# Altium footprint library 3.22-杂项.PcbLib: 199 footprints (part 11 of 15)
Each footprint in its own frame and in the unit in brackets; x right, y up, seen from the top. Pads: shape width x height; smd on the part's side, far side on the other; paste and mask are expansions set on the pad; w line width, h text height; cw(c..) or ccw(c..) is an arc to the next point about the centre after c.
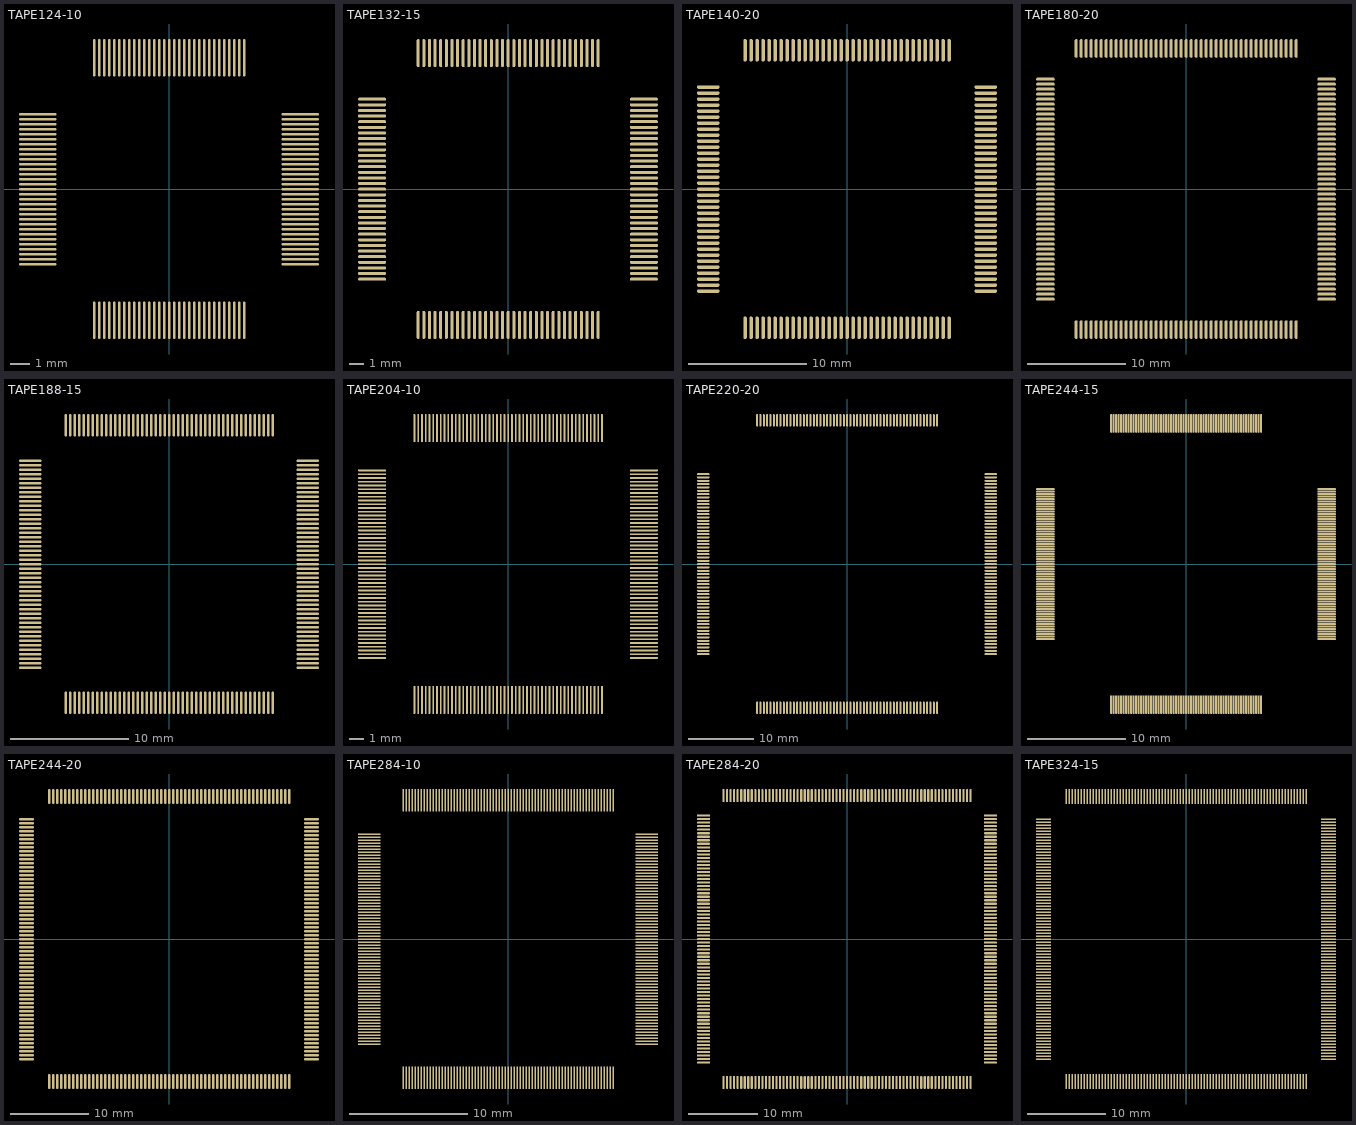
[diagram p10: the footprints below, top view; thin cyan lines are the x and y axes]

## TAPE124-10 [mil]
pads (124):
  oval 75x5 smd: 1(-262.5,149.5) 2(-262.5,139.5) 3(-262.5,129.5) 4(-262.5,119.5) 5(-262.5,109.5) 6(-262.5,99.5) 7(-262.5,89.5) 8(-262.5,79.5) 9(-262.5,69.5) 10(-262.5,59.5) 11(-262.5,49.5) 12(-262.5,39.5) 13(-262.5,29.5) 14(-262.5,19.5) 15(-262.5,9.5) 16(-262.5,-0.5) 17(-262.5,-10.5) 18(-262.5,-20.5) 19(-262.5,-30.5) 20(-262.5,-40.5) 21(-262.5,-50.5) 22(-262.5,-60.5) 23(-262.5,-70.5) 24(-262.5,-80.5) 25(-262.5,-90.5) 26(-262.5,-100.5) 27(-262.5,-110.5) 28(-262.5,-120.5) 29(-262.5,-130.5) 30(-262.5,-140.5) 31(-262.5,-150.5) 63(262.5,-150.5) 64(262.5,-140.5) 65(262.5,-130.5) 66(262.5,-120.5) 67(262.5,-110.5) 68(262.5,-100.5) 69(262.5,-90.5) 70(262.5,-80.5) 71(262.5,-70.5) 72(262.5,-60.5) 73(262.5,-50.5) 74(262.5,-40.5) 75(262.5,-30.5) 76(262.5,-20.5) 77(262.5,-10.5) 78(262.5,-0.5) 79(262.5,9.5) 80(262.5,19.5) 81(262.5,29.5) 82(262.5,39.5) 83(262.5,49.5) 84(262.5,59.5) 85(262.5,69.5) 86(262.5,79.5) 87(262.5,89.5) 88(262.5,99.5) 89(262.5,109.5) 90(262.5,119.5) 91(262.5,129.5) 92(262.5,139.5) 93(262.5,149.5)
  oval 5x75 smd: 32(-149.5,-262.5) 33(-139.5,-262.5) 34(-129.5,-262.5) 35(-119.5,-262.5) 36(-109.5,-262.5) 37(-99.5,-262.5) 38(-89.5,-262.5) 39(-79.5,-262.5) 40(-69.5,-262.5) 41(-59.5,-262.5) 42(-49.5,-262.5) 43(-39.5,-262.5) 44(-29.5,-262.5) 45(-19.5,-262.5) 46(-9.5,-262.5) 47(0.5,-262.5) 48(10.5,-262.5) 49(20.5,-262.5) 50(30.5,-262.5) 51(40.5,-262.5) 52(50.5,-262.5) 53(60.5,-262.5) 54(70.5,-262.5) 55(80.5,-262.5) 56(90.5,-262.5) 57(100.5,-262.5) 58(110.5,-262.5) 59(120.5,-262.5) 60(130.5,-262.5) 61(140.5,-262.5) 62(150.5,-262.5) 94(150.5,262.5) 95(140.5,262.5) 96(130.5,262.5) 97(120.5,262.5) 98(110.5,262.5) 99(100.5,262.5) 100(90.5,262.5) 101(80.5,262.5) 102(70.5,262.5) 103(60.5,262.5) 104(50.5,262.5) 105(40.5,262.5) 106(30.5,262.5) 107(20.5,262.5) 108(10.5,262.5) 109(0.5,262.5) 110(-9.5,262.5) 111(-19.5,262.5) 112(-29.5,262.5) 113(-39.5,262.5) 114(-49.5,262.5) 115(-59.5,262.5) 116(-69.5,262.5) 117(-79.5,262.5) 118(-89.5,262.5) 119(-99.5,262.5) 120(-109.5,262.5) 121(-119.5,262.5) 122(-129.5,262.5) 123(-139.5,262.5) 124(-149.5,262.5)

## TAPE132-15 [mil]
pads (132):
  oval 75x8 smd: 1(-362.5,239.5) 2(-362.5,224.5) 3(-362.5,209.5) 4(-362.5,194.5) 5(-362.5,179.5) 6(-362.5,164.5) 7(-362.5,149.5) 8(-362.5,134.5) 9(-362.5,119.5) 10(-362.5,104.5) 11(-362.5,89.5) 12(-362.5,74.5) 13(-362.5,59.5) 14(-362.5,44.5) 15(-362.5,29.5) 16(-362.5,14.5) 17(-362.5,-0.5) 18(-362.5,-15.5) 19(-362.5,-30.5) 20(-362.5,-45.5) 21(-362.5,-60.5) 22(-362.5,-75.5) 23(-362.5,-90.5) 24(-362.5,-105.5) 25(-362.5,-120.5) 26(-362.5,-135.5) 27(-362.5,-150.5) 28(-362.5,-165.5) 29(-362.5,-180.5) 30(-362.5,-195.5) 31(-362.5,-210.5) 32(-362.5,-225.5) 33(-362.5,-240.5) 67(362.5,-240.5) 68(362.5,-225.5) 69(362.5,-210.5) 70(362.5,-195.5) 71(362.5,-180.5) 72(362.5,-165.5) 73(362.5,-150.5) 74(362.5,-135.5) 75(362.5,-120.5) 76(362.5,-105.5) 77(362.5,-90.5) 78(362.5,-75.5) 79(362.5,-60.5) 80(362.5,-45.5) 81(362.5,-30.5) 82(362.5,-15.5) 83(362.5,-0.5) 84(362.5,14.5) 85(362.5,29.5) 86(362.5,44.5) 87(362.5,59.5) 88(362.5,74.5) 89(362.5,89.5) 90(362.5,104.5) 91(362.5,119.5) 92(362.5,134.5) 93(362.5,149.5) 94(362.5,164.5) 95(362.5,179.5) 96(362.5,194.5) 97(362.5,209.5) 98(362.5,224.5) 99(362.5,239.5)
  oval 8x75 smd: 34(-239.5,-362.5) 35(-224.5,-362.5) 36(-209.5,-362.5) 37(-194.5,-362.5) 38(-179.5,-362.5) 39(-164.5,-362.5) 40(-149.5,-362.5) 41(-134.5,-362.5) 42(-119.5,-362.5) 43(-104.5,-362.5) 44(-89.5,-362.5) 45(-74.5,-362.5) 46(-59.5,-362.5) 47(-44.5,-362.5) 48(-29.5,-362.5) 49(-14.5,-362.5) 50(0.5,-362.5) 51(15.5,-362.5) 52(30.5,-362.5) 53(45.5,-362.5) 54(60.5,-362.5) 55(75.5,-362.5) 56(90.5,-362.5) 57(105.5,-362.5) 58(120.5,-362.5) 59(135.5,-362.5) 60(150.5,-362.5) 61(165.5,-362.5) 62(180.5,-362.5) 63(195.5,-362.5) 64(210.5,-362.5) 65(225.5,-362.5) 66(240.5,-362.5) 100(240.5,362.5) 101(225.5,362.5) 102(210.5,362.5) 103(195.5,362.5) 104(180.5,362.5) 105(165.5,362.5) 106(150.5,362.5) 107(135.5,362.5) 108(120.5,362.5) 109(105.5,362.5) 110(90.5,362.5) 111(75.5,362.5) 112(60.5,362.5) 113(45.5,362.5) 114(30.5,362.5) 115(15.5,362.5) 116(0.5,362.5) 117(-14.5,362.5) 118(-29.5,362.5) 119(-44.5,362.5) 120(-59.5,362.5) 121(-74.5,362.5) 122(-89.5,362.5) 123(-104.5,362.5) 124(-119.5,362.5) 125(-134.5,362.5) 126(-149.5,362.5) 127(-164.5,362.5) 128(-179.5,362.5) 129(-194.5,362.5) 130(-209.5,362.5) 131(-224.5,362.5) 132(-239.5,362.5)

## TAPE140-20 [mil]
pads (140):
  oval 75x12 smd: 1(-462.5,339.5) 2(-462.5,319.5) 3(-462.5,299.5) 4(-462.5,279.5) 5(-462.5,259.5) 6(-462.5,239.5) 7(-462.5,219.5) 8(-462.5,199.5) 9(-462.5,179.5) 10(-462.5,159.5) 11(-462.5,139.5) 12(-462.5,119.5) 13(-462.5,99.5) 14(-462.5,79.5) 15(-462.5,59.5) 16(-462.5,39.5) 17(-462.5,19.5) 18(-462.5,-0.5) 19(-462.5,-20.5) 20(-462.5,-40.5) 21(-462.5,-60.5) 22(-462.5,-80.5) 23(-462.5,-100.5) 24(-462.5,-120.5) 25(-462.5,-140.5) 26(-462.5,-160.5) 27(-462.5,-180.5) 28(-462.5,-200.5) 29(-462.5,-220.5) 30(-462.5,-240.5) 31(-462.5,-260.5) 32(-462.5,-280.5) 33(-462.5,-300.5) 34(-462.5,-320.5) 35(-462.5,-340.5) 71(462.5,-340.5) 72(462.5,-320.5) 73(462.5,-300.5) 74(462.5,-280.5) 75(462.5,-260.5) 76(462.5,-240.5) 77(462.5,-220.5) 78(462.5,-200.5) 79(462.5,-180.5) 80(462.5,-160.5) 81(462.5,-140.5) 82(462.5,-120.5) 83(462.5,-100.5) 84(462.5,-80.5) 85(462.5,-60.5) 86(462.5,-40.5) 87(462.5,-20.5) 88(462.5,-0.5) 89(462.5,19.5) 90(462.5,39.5) 91(462.5,59.5) 92(462.5,79.5) 93(462.5,99.5) 94(462.5,119.5) 95(462.5,139.5) 96(462.5,159.5) 97(462.5,179.5) 98(462.5,199.5) 99(462.5,219.5) 100(462.5,239.5) 101(462.5,259.5) 102(462.5,279.5) 103(462.5,299.5) 104(462.5,319.5) 105(462.5,339.5)
  oval 12x75 smd: 36(-339.5,-462.5) 37(-319.5,-462.5) 38(-299.5,-462.5) 39(-279.5,-462.5) 40(-259.5,-462.5) 41(-239.5,-462.5) 42(-219.5,-462.5) 43(-199.5,-462.5) 44(-179.5,-462.5) 45(-159.5,-462.5) 46(-139.5,-462.5) 47(-119.5,-462.5) 48(-99.5,-462.5) 49(-79.5,-462.5) 50(-59.5,-462.5) 51(-39.5,-462.5) 52(-19.5,-462.5) 53(0.5,-462.5) 54(20.5,-462.5) 55(40.5,-462.5) 56(60.5,-462.5) 57(80.5,-462.5) 58(100.5,-462.5) 59(120.5,-462.5) 60(140.5,-462.5) 61(160.5,-462.5) 62(180.5,-462.5) 63(200.5,-462.5) 64(220.5,-462.5) 65(240.5,-462.5) 66(260.5,-462.5) 67(280.5,-462.5) 68(300.5,-462.5) 69(320.5,-462.5) 70(340.5,-462.5) 106(340.5,462.5) 107(320.5,462.5) 108(300.5,462.5) 109(280.5,462.5) 110(260.5,462.5) 111(240.5,462.5) 112(220.5,462.5) 113(200.5,462.5) 114(180.5,462.5) 115(160.5,462.5) 116(140.5,462.5) 117(120.5,462.5) 118(100.5,462.5) 119(80.5,462.5) 120(60.5,462.5) 121(40.5,462.5) 122(20.5,462.5) 123(0.5,462.5) 124(-19.5,462.5) 125(-39.5,462.5) 126(-59.5,462.5) 127(-79.5,462.5) 128(-99.5,462.5) 129(-119.5,462.5) 130(-139.5,462.5) 131(-159.5,462.5) 132(-179.5,462.5) 133(-199.5,462.5) 134(-219.5,462.5) 135(-239.5,462.5) 136(-259.5,462.5) 137(-279.5,462.5) 138(-299.5,462.5) 139(-319.5,462.5) 140(-339.5,462.5)

## TAPE180-20 [mil]
pads (180):
  oval 75x12 smd: 1(-562.5,439.5) 2(-562.5,419.5) 3(-562.5,399.5) 4(-562.5,379.5) 5(-562.5,359.5) 6(-562.5,339.5) 7(-562.5,319.5) 8(-562.5,299.5) 9(-562.5,279.5) 10(-562.5,259.5) 11(-562.5,239.5) 12(-562.5,219.5) 13(-562.5,199.5) 14(-562.5,179.5) 15(-562.5,159.5) 16(-562.5,139.5) 17(-562.5,119.5) 18(-562.5,99.5) 19(-562.5,79.5) 20(-562.5,59.5) 21(-562.5,39.5) 22(-562.5,19.5) 23(-562.5,-0.5) 24(-562.5,-20.5) 25(-562.5,-40.5) 26(-562.5,-60.5) 27(-562.5,-80.5) 28(-562.5,-100.5) 29(-562.5,-120.5) 30(-562.5,-140.5) 31(-562.5,-160.5) 32(-562.5,-180.5) 33(-562.5,-200.5) 34(-562.5,-220.5) 35(-562.5,-240.5) 36(-562.5,-260.5) 37(-562.5,-280.5) 38(-562.5,-300.5) 39(-562.5,-320.5) 40(-562.5,-340.5) 41(-562.5,-360.5) 42(-562.5,-380.5) 43(-562.5,-400.5) 44(-562.5,-420.5) 45(-562.5,-440.5) 91(562.5,-440.5) 92(562.5,-420.5) 93(562.5,-400.5) 94(562.5,-380.5) 95(562.5,-360.5) 96(562.5,-340.5) 97(562.5,-320.5) 98(562.5,-300.5) 99(562.5,-280.5) 100(562.5,-260.5) 101(562.5,-240.5) 102(562.5,-220.5) 103(562.5,-200.5) 104(562.5,-180.5) 105(562.5,-160.5) 106(562.5,-140.5) 107(562.5,-120.5) 108(562.5,-100.5) 109(562.5,-80.5) 110(562.5,-60.5) 111(562.5,-40.5) 112(562.5,-20.5) 113(562.5,-0.5) 114(562.5,19.5) 115(562.5,39.5) 116(562.5,59.5) 117(562.5,79.5) 118(562.5,99.5) 119(562.5,119.5) 120(562.5,139.5) 121(562.5,159.5) 122(562.5,179.5) 123(562.5,199.5) 124(562.5,219.5) 125(562.5,239.5) 126(562.5,259.5) 127(562.5,279.5) 128(562.5,299.5) 129(562.5,319.5) 130(562.5,339.5) 131(562.5,359.5) 132(562.5,379.5) 133(562.5,399.5) 134(562.5,419.5) 135(562.5,439.5)
  oval 12x75 smd: 46(-439.5,-562.5) 47(-419.5,-562.5) 48(-399.5,-562.5) 49(-379.5,-562.5) 50(-359.5,-562.5) 51(-339.5,-562.5) 52(-319.5,-562.5) 53(-299.5,-562.5) 54(-279.5,-562.5) 55(-259.5,-562.5) 56(-239.5,-562.5) 57(-219.5,-562.5) 58(-199.5,-562.5) 59(-179.5,-562.5) 60(-159.5,-562.5) 61(-139.5,-562.5) 62(-119.5,-562.5) 63(-99.5,-562.5) 64(-79.5,-562.5) 65(-59.5,-562.5) 66(-39.5,-562.5) 67(-19.5,-562.5) 68(0.5,-562.5) 69(20.5,-562.5) 70(40.5,-562.5) 71(60.5,-562.5) 72(80.5,-562.5) 73(100.5,-562.5) 74(120.5,-562.5) 75(140.5,-562.5) 76(160.5,-562.5) 77(180.5,-562.5) 78(200.5,-562.5) 79(220.5,-562.5) 80(240.5,-562.5) 81(260.5,-562.5) 82(280.5,-562.5) 83(300.5,-562.5) 84(320.5,-562.5) 85(340.5,-562.5) 86(360.5,-562.5) 87(380.5,-562.5) 88(400.5,-562.5) 89(420.5,-562.5) 90(440.5,-562.5) 136(440.5,562.5) 137(420.5,562.5) 138(400.5,562.5) 139(380.5,562.5) 140(360.5,562.5) 141(340.5,562.5) 142(320.5,562.5) 143(300.5,562.5) 144(280.5,562.5) 145(260.5,562.5) 146(240.5,562.5) 147(220.5,562.5) 148(200.5,562.5) 149(180.5,562.5) 150(160.5,562.5) 151(140.5,562.5) 152(120.5,562.5) 153(100.5,562.5) 154(80.5,562.5) 155(60.5,562.5) 156(40.5,562.5) 157(20.5,562.5) 158(0.5,562.5) 159(-19.5,562.5) 160(-39.5,562.5) 161(-59.5,562.5) 162(-79.5,562.5) 163(-99.5,562.5) 164(-119.5,562.5) 165(-139.5,562.5) 166(-159.5,562.5) 167(-179.5,562.5) 168(-199.5,562.5) 169(-219.5,562.5) 170(-239.5,562.5) 171(-259.5,562.5) 172(-279.5,562.5) 173(-299.5,562.5) 174(-319.5,562.5) 175(-339.5,562.5) 176(-359.5,562.5) 177(-379.5,562.5) 178(-399.5,562.5) 179(-419.5,562.5) 180(-439.5,562.5)

## TAPE188-15 [mil]
pads (188):
  oval 75x8 smd: 1(-462.5,344.5) 2(-462.5,329.5) 3(-462.5,314.5) 4(-462.5,299.5) 5(-462.5,284.5) 6(-462.5,269.5) 7(-462.5,254.5) 8(-462.5,239.5) 9(-462.5,224.5) 10(-462.5,209.5) 11(-462.5,194.5) 12(-462.5,179.5) 13(-462.5,164.5) 14(-462.5,149.5) 15(-462.5,134.5) 16(-462.5,119.5) 17(-462.5,104.5) 18(-462.5,89.5) 19(-462.5,74.5) 20(-462.5,59.5) 21(-462.5,44.5) 22(-462.5,29.5) 23(-462.5,14.5) 24(-462.5,-0.5) 25(-462.5,-15.5) 26(-462.5,-30.5) 27(-462.5,-45.5) 28(-462.5,-60.5) 29(-462.5,-75.5) 30(-462.5,-90.5) 31(-462.5,-105.5) 32(-462.5,-120.5) 33(-462.5,-135.5) 34(-462.5,-150.5) 35(-462.5,-165.5) 36(-462.5,-180.5) 37(-462.5,-195.5) 38(-462.5,-210.5) 39(-462.5,-225.5) 40(-462.5,-240.5) 41(-462.5,-255.5) 42(-462.5,-270.5) 43(-462.5,-285.5) 44(-462.5,-300.5) 45(-462.5,-315.5) 46(-462.5,-330.5) 47(-462.5,-345.5) 95(462.5,-345.5) 96(462.5,-330.5) 97(462.5,-315.5) 98(462.5,-300.5) 99(462.5,-285.5) 100(462.5,-270.5) 101(462.5,-255.5) 102(462.5,-240.5) 103(462.5,-225.5) 104(462.5,-210.5) 105(462.5,-195.5) 106(462.5,-180.5) 107(462.5,-165.5) 108(462.5,-150.5) 109(462.5,-135.5) 110(462.5,-120.5) 111(462.5,-105.5) 112(462.5,-90.5) 113(462.5,-75.5) 114(462.5,-60.5) 115(462.5,-45.5) 116(462.5,-30.5) 117(462.5,-15.5) 118(462.5,-0.5) 119(462.5,14.5) 120(462.5,29.5) 121(462.5,44.5) 122(462.5,59.5) 123(462.5,74.5) 124(462.5,89.5) 125(462.5,104.5) 126(462.5,119.5) 127(462.5,134.5) 128(462.5,149.5) 129(462.5,164.5) 130(462.5,179.5) 131(462.5,194.5) 132(462.5,209.5) 133(462.5,224.5) 134(462.5,239.5) 135(462.5,254.5) 136(462.5,269.5) 137(462.5,284.5) 138(462.5,299.5) 139(462.5,314.5) 140(462.5,329.5) 141(462.5,344.5)
  oval 8x75 smd: 48(-344.5,-462.5) 49(-329.5,-462.5) 50(-314.5,-462.5) 51(-299.5,-462.5) 52(-284.5,-462.5) 53(-269.5,-462.5) 54(-254.5,-462.5) 55(-239.5,-462.5) 56(-224.5,-462.5) 57(-209.5,-462.5) 58(-194.5,-462.5) 59(-179.5,-462.5) 60(-164.5,-462.5) 61(-149.5,-462.5) 62(-134.5,-462.5) 63(-119.5,-462.5) 64(-104.5,-462.5) 65(-89.5,-462.5) 66(-74.5,-462.5) 67(-59.5,-462.5) 68(-44.5,-462.5) 69(-29.5,-462.5) 70(-14.5,-462.5) 71(0.5,-462.5) 72(15.5,-462.5) 73(30.5,-462.5) 74(45.5,-462.5) 75(60.5,-462.5) 76(75.5,-462.5) 77(90.5,-462.5) 78(105.5,-462.5) 79(120.5,-462.5) 80(135.5,-462.5) 81(150.5,-462.5) 82(165.5,-462.5) 83(180.5,-462.5) 84(195.5,-462.5) 85(210.5,-462.5) 86(225.5,-462.5) 87(240.5,-462.5) 88(255.5,-462.5) 89(270.5,-462.5) 90(285.5,-462.5) 91(300.5,-462.5) 92(315.5,-462.5) 93(330.5,-462.5) 94(345.5,-462.5) 142(345.5,462.5) 143(330.5,462.5) 144(315.5,462.5) 145(300.5,462.5) 146(285.5,462.5) 147(270.5,462.5) 148(255.5,462.5) 149(240.5,462.5) 150(225.5,462.5) 151(210.5,462.5) 152(195.5,462.5) 153(180.5,462.5) 154(165.5,462.5) 155(150.5,462.5) 156(135.5,462.5) 157(120.5,462.5) 158(105.5,462.5) 159(90.5,462.5) 160(75.5,462.5) 161(60.5,462.5) 162(45.5,462.5) 163(30.5,462.5) 164(15.5,462.5) 165(0.5,462.5) 166(-14.5,462.5) 167(-29.5,462.5) 168(-44.5,462.5) 169(-59.5,462.5) 170(-74.5,462.5) 171(-89.5,462.5) 172(-104.5,462.5) 173(-119.5,462.5) 174(-134.5,462.5) 175(-149.5,462.5) 176(-164.5,462.5) 177(-179.5,462.5) 178(-194.5,462.5) 179(-209.5,462.5) 180(-224.5,462.5) 181(-239.5,462.5) 182(-254.5,462.5) 183(-269.5,462.5) 184(-284.5,462.5) 185(-299.5,462.5) 186(-314.5,462.5) 187(-329.5,462.5) 188(-344.5,462.5)

## TAPE204-10 [mil]
pads (204):
  oval 75x5 smd: 1(-362.5,249.5) 2(-362.5,239.5) 3(-362.5,229.5) 4(-362.5,219.5) 5(-362.5,209.5) 6(-362.5,199.5) 7(-362.5,189.5) 8(-362.5,179.5) 9(-362.5,169.5) 10(-362.5,159.5) 11(-362.5,149.5) 12(-362.5,139.5) 13(-362.5,129.5) 14(-362.5,119.5) 15(-362.5,109.5) 16(-362.5,99.5) 17(-362.5,89.5) 18(-362.5,79.5) 19(-362.5,69.5) 20(-362.5,59.5) 21(-362.5,49.5) 22(-362.5,39.5) 23(-362.5,29.5) 24(-362.5,19.5) 25(-362.5,9.5) 26(-362.5,-0.5) 27(-362.5,-10.5) 28(-362.5,-20.5) 29(-362.5,-30.5) 30(-362.5,-40.5) 31(-362.5,-50.5) 32(-362.5,-60.5) 33(-362.5,-70.5) 34(-362.5,-80.5) 35(-362.5,-90.5) 36(-362.5,-100.5) 37(-362.5,-110.5) 38(-362.5,-120.5) 39(-362.5,-130.5) 40(-362.5,-140.5) 41(-362.5,-150.5) 42(-362.5,-160.5) 43(-362.5,-170.5) 44(-362.5,-180.5) 45(-362.5,-190.5) 46(-362.5,-200.5) 47(-362.5,-210.5) 48(-362.5,-220.5) 49(-362.5,-230.5) 50(-362.5,-240.5) 51(-362.5,-250.5) 103(362.5,-250.5) 104(362.5,-240.5) 105(362.5,-230.5) 106(362.5,-220.5) 107(362.5,-210.5) 108(362.5,-200.5) 109(362.5,-190.5) 110(362.5,-180.5) 111(362.5,-170.5) 112(362.5,-160.5) 113(362.5,-150.5) 114(362.5,-140.5) 115(362.5,-130.5) 116(362.5,-120.5) 117(362.5,-110.5) 118(362.5,-100.5) 119(362.5,-90.5) 120(362.5,-80.5) 121(362.5,-70.5) 122(362.5,-60.5) 123(362.5,-50.5) 124(362.5,-40.5) 125(362.5,-30.5) 126(362.5,-20.5) 127(362.5,-10.5) 128(362.5,-0.5) 129(362.5,9.5) 130(362.5,19.5) 131(362.5,29.5) 132(362.5,39.5) 133(362.5,49.5) 134(362.5,59.5) 135(362.5,69.5) 136(362.5,79.5) 137(362.5,89.5) 138(362.5,99.5) 139(362.5,109.5) 140(362.5,119.5) 141(362.5,129.5) 142(362.5,139.5) 143(362.5,149.5) 144(362.5,159.5) 145(362.5,169.5) 146(362.5,179.5) 147(362.5,189.5) 148(362.5,199.5) 149(362.5,209.5) 150(362.5,219.5) 151(362.5,229.5) 152(362.5,239.5) 153(362.5,249.5)
  oval 5x75 smd: 52(-249.5,-362.5) 53(-239.5,-362.5) 54(-229.5,-362.5) 55(-219.5,-362.5) 56(-209.5,-362.5) 57(-199.5,-362.5) 58(-189.5,-362.5) 59(-179.5,-362.5) 60(-169.5,-362.5) 61(-159.5,-362.5) 62(-149.5,-362.5) 63(-139.5,-362.5) 64(-129.5,-362.5) 65(-119.5,-362.5) 66(-109.5,-362.5) 67(-99.5,-362.5) 68(-89.5,-362.5) 69(-79.5,-362.5) 70(-69.5,-362.5) 71(-59.5,-362.5) 72(-49.5,-362.5) 73(-39.5,-362.5) 74(-29.5,-362.5) 75(-19.5,-362.5) 76(-9.5,-362.5) 77(0.5,-362.5) 78(10.5,-362.5) 79(20.5,-362.5) 80(30.5,-362.5) 81(40.5,-362.5) 82(50.5,-362.5) 83(60.5,-362.5) 84(70.5,-362.5) 85(80.5,-362.5) 86(90.5,-362.5) 87(100.5,-362.5) 88(110.5,-362.5) 89(120.5,-362.5) 90(130.5,-362.5) 91(140.5,-362.5) 92(150.5,-362.5) 93(160.5,-362.5) 94(170.5,-362.5) 95(180.5,-362.5) 96(190.5,-362.5) 97(200.5,-362.5) 98(210.5,-362.5) 99(220.5,-362.5) 100(230.5,-362.5) 101(240.5,-362.5) 102(250.5,-362.5) 154(250.5,362.5) 155(240.5,362.5) 156(230.5,362.5) 157(220.5,362.5) 158(210.5,362.5) 159(200.5,362.5) 160(190.5,362.5) 161(180.5,362.5) 162(170.5,362.5) 163(160.5,362.5) 164(150.5,362.5) 165(140.5,362.5) 166(130.5,362.5) 167(120.5,362.5) 168(110.5,362.5) 169(100.5,362.5) 170(90.5,362.5) 171(80.5,362.5) 172(70.5,362.5) 173(60.5,362.5) 174(50.5,362.5) 175(40.5,362.5) 176(30.5,362.5) 177(20.5,362.5) 178(10.5,362.5) 179(0.5,362.5) 180(-9.5,362.5) 181(-19.5,362.5) 182(-29.5,362.5) 183(-39.5,362.5) 184(-49.5,362.5) 185(-59.5,362.5) 186(-69.5,362.5) 187(-79.5,362.5) 188(-89.5,362.5) 189(-99.5,362.5) 190(-109.5,362.5) 191(-119.5,362.5) 192(-129.5,362.5) 193(-139.5,362.5) 194(-149.5,362.5) 195(-159.5,362.5) 196(-169.5,362.5) 197(-179.5,362.5) 198(-189.5,362.5) 199(-199.5,362.5) 200(-209.5,362.5) 201(-219.5,362.5) 202(-229.5,362.5) 203(-239.5,362.5) 204(-249.5,362.5)

## TAPE220-20 [mil]
pads (220):
  oval 75x12 smd: 1(-862.5,539.5) 2(-862.5,519.5) 3(-862.5,499.5) 4(-862.5,479.5) 5(-862.5,459.5) 6(-862.5,439.5) 7(-862.5,419.5) 8(-862.5,399.5) 9(-862.5,379.5) 10(-862.5,359.5) 11(-862.5,339.5) 12(-862.5,319.5) 13(-862.5,299.5) 14(-862.5,279.5) 15(-862.5,259.5) 16(-862.5,239.5) 17(-862.5,219.5) 18(-862.5,199.5) 19(-862.5,179.5) 20(-862.5,159.5) 21(-862.5,139.5) 22(-862.5,119.5) 23(-862.5,99.5) 24(-862.5,79.5) 25(-862.5,59.5) 26(-862.5,39.5) 27(-862.5,19.5) 28(-862.5,-0.5) 29(-862.5,-20.5) 30(-862.5,-40.5) 31(-862.5,-60.5) 32(-862.5,-80.5) 33(-862.5,-100.5) 34(-862.5,-120.5) 35(-862.5,-140.5) 36(-862.5,-160.5) 37(-862.5,-180.5) 38(-862.5,-200.5) 39(-862.5,-220.5) 40(-862.5,-240.5) 41(-862.5,-260.5) 42(-862.5,-280.5) 43(-862.5,-300.5) 44(-862.5,-320.5) 45(-862.5,-340.5) 46(-862.5,-360.5) 47(-862.5,-380.5) 48(-862.5,-400.5) 49(-862.5,-420.5) 50(-862.5,-440.5) 51(-862.5,-460.5) 52(-862.5,-480.5) 53(-862.5,-500.5) 54(-862.5,-520.5) 55(-862.5,-540.5) 111(862.5,-540.5) 112(862.5,-520.5) 113(862.5,-500.5) 114(862.5,-480.5) 115(862.5,-460.5) 116(862.5,-440.5) 117(862.5,-420.5) 118(862.5,-400.5) 119(862.5,-380.5) 120(862.5,-360.5) 121(862.5,-340.5) 122(862.5,-320.5) 123(862.5,-300.5) 124(862.5,-280.5) 125(862.5,-260.5) 126(862.5,-240.5) 127(862.5,-220.5) 128(862.5,-200.5) 129(862.5,-180.5) 130(862.5,-160.5) 131(862.5,-140.5) 132(862.5,-120.5) 133(862.5,-100.5) 134(862.5,-80.5) 135(862.5,-60.5) 136(862.5,-40.5) 137(862.5,-20.5) 138(862.5,-0.5) 139(862.5,19.5) 140(862.5,39.5) 141(862.5,59.5) 142(862.5,79.5) 143(862.5,99.5) 144(862.5,119.5) 145(862.5,139.5) 146(862.5,159.5) 147(862.5,179.5) 148(862.5,199.5) 149(862.5,219.5) 150(862.5,239.5) 151(862.5,259.5) 152(862.5,279.5) 153(862.5,299.5) 154(862.5,319.5) 155(862.5,339.5) 156(862.5,359.5) 157(862.5,379.5) 158(862.5,399.5) 159(862.5,419.5) 160(862.5,439.5) 161(862.5,459.5) 162(862.5,479.5) 163(862.5,499.5) 164(862.5,519.5) 165(862.5,539.5)
  oval 12x75 smd: 56(-539.5,-862.5) 57(-519.5,-862.5) 58(-499.5,-862.5) 59(-479.5,-862.5) 60(-459.5,-862.5) 61(-439.5,-862.5) 62(-419.5,-862.5) 63(-399.5,-862.5) 64(-379.5,-862.5) 65(-359.5,-862.5) 66(-339.5,-862.5) 67(-319.5,-862.5) 68(-299.5,-862.5) 69(-279.5,-862.5) 70(-259.5,-862.5) 71(-239.5,-862.5) 72(-219.5,-862.5) 73(-199.5,-862.5) 74(-179.5,-862.5) 75(-159.5,-862.5) 76(-139.5,-862.5) 77(-119.5,-862.5) 78(-99.5,-862.5) 79(-79.5,-862.5) 80(-59.5,-862.5) 81(-39.5,-862.5) 82(-19.5,-862.5) 83(0.5,-862.5) 84(20.5,-862.5) 85(40.5,-862.5) 86(60.5,-862.5) 87(80.5,-862.5) 88(100.5,-862.5) 89(120.5,-862.5) 90(140.5,-862.5) 91(160.5,-862.5) 92(180.5,-862.5) 93(200.5,-862.5) 94(220.5,-862.5) 95(240.5,-862.5) 96(260.5,-862.5) 97(280.5,-862.5) 98(300.5,-862.5) 99(320.5,-862.5) 100(340.5,-862.5) 101(360.5,-862.5) 102(380.5,-862.5) 103(400.5,-862.5) 104(420.5,-862.5) 105(440.5,-862.5) 106(460.5,-862.5) 107(480.5,-862.5) 108(500.5,-862.5) 109(520.5,-862.5) 110(540.5,-862.5) 166(540.5,862.5) 167(520.5,862.5) 168(500.5,862.5) 169(480.5,862.5) 170(460.5,862.5) 171(440.5,862.5) 172(420.5,862.5) 173(400.5,862.5) 174(380.5,862.5) 175(360.5,862.5) 176(340.5,862.5) 177(320.5,862.5) 178(300.5,862.5) 179(280.5,862.5) 180(260.5,862.5) 181(240.5,862.5) 182(220.5,862.5) 183(200.5,862.5) 184(180.5,862.5) 185(160.5,862.5) 186(140.5,862.5) 187(120.5,862.5) 188(100.5,862.5) 189(80.5,862.5) 190(60.5,862.5) 191(40.5,862.5) 192(20.5,862.5) 193(0.5,862.5) 194(-19.5,862.5) 195(-39.5,862.5) 196(-59.5,862.5) 197(-79.5,862.5) 198(-99.5,862.5) 199(-119.5,862.5) 200(-139.5,862.5) 201(-159.5,862.5) 202(-179.5,862.5) 203(-199.5,862.5) 204(-219.5,862.5) 205(-239.5,862.5) 206(-259.5,862.5) 207(-279.5,862.5) 208(-299.5,862.5) 209(-319.5,862.5) 210(-339.5,862.5) 211(-359.5,862.5) 212(-379.5,862.5) 213(-399.5,862.5) 214(-419.5,862.5) 215(-439.5,862.5) 216(-459.5,862.5) 217(-479.5,862.5) 218(-499.5,862.5) 219(-519.5,862.5) 220(-539.5,862.5)
